# Altium schematic symbol library SignalCommunications.SCHLIB: 804 symbols (part 5 of 9)
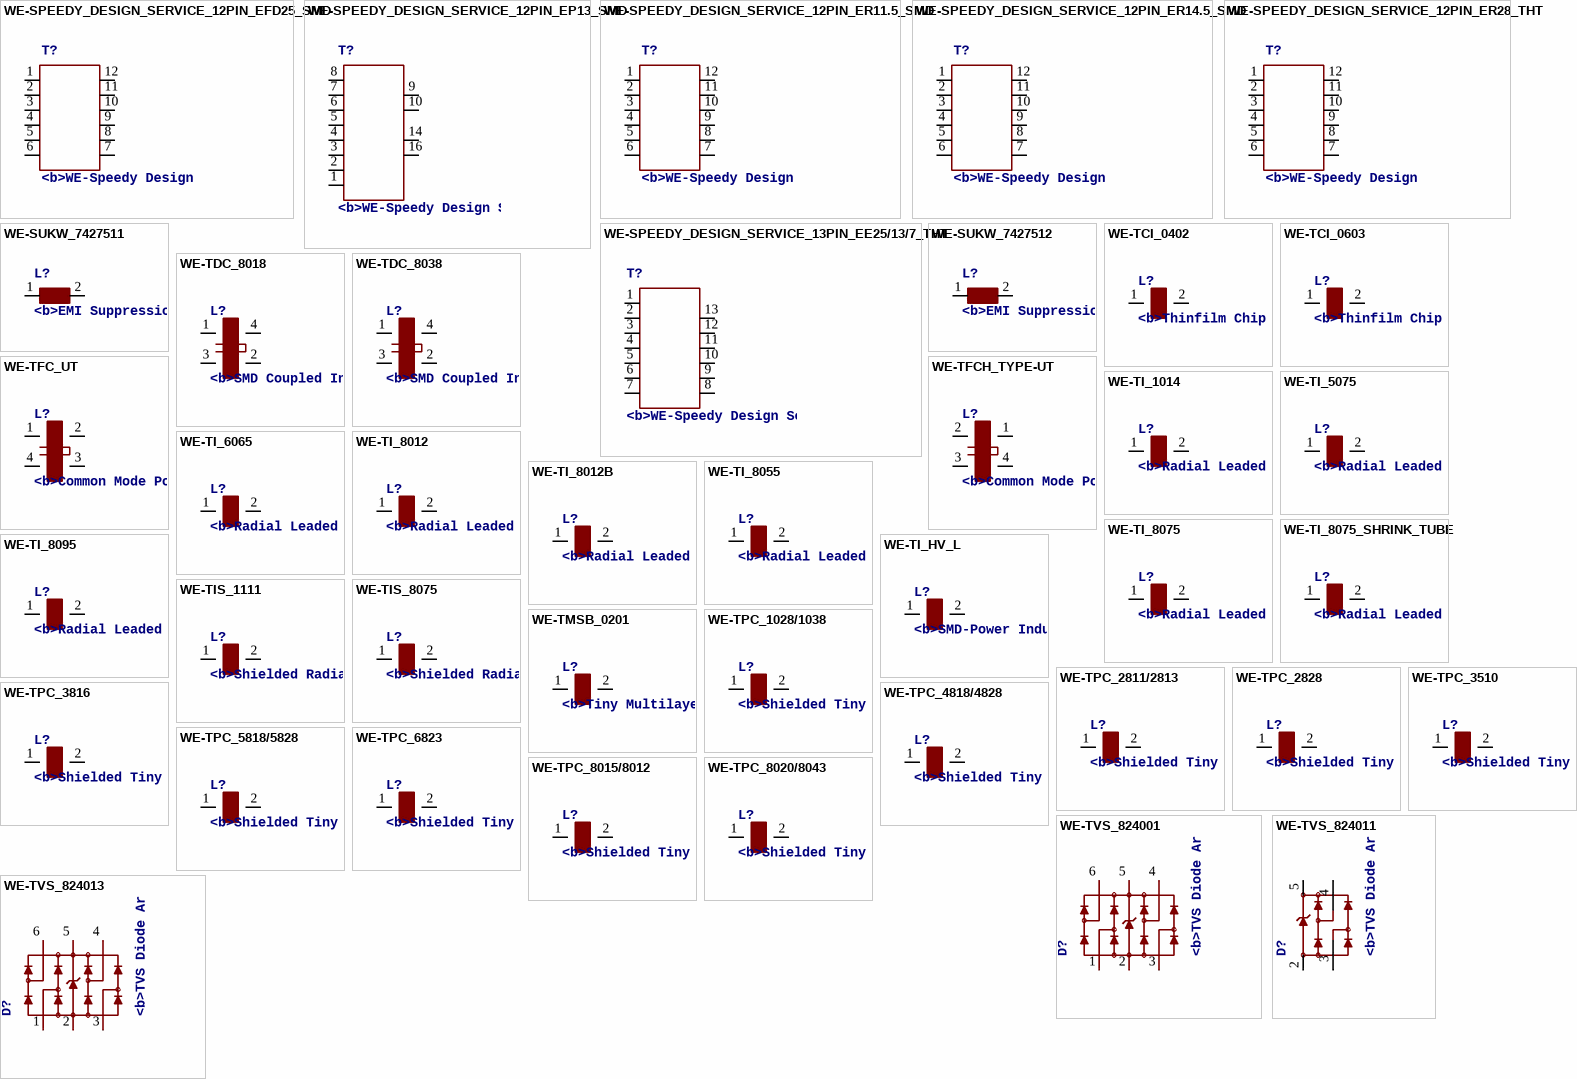
[diagram p46: symbols WE-SPEEDY_DESIGN_SERVICE_12PIN_EFD25_SMD to WE-TVS_824013]

## WE-SPEEDY_DESIGN_SERVICE_12PIN_EP13_SMD
designator T?, comment <b>WE-Speedy Design Service, 12 Pin</b><br><br> / - Any application that fits package style <br> / - Switch Mode Power: Flyback, Forward, Push-Pull, Coupled Inductor<br><br> / -- Telecom Applications: xDSL, POTS Splitter Inductors
footprint WE_EP13_SMD_12PIN
pins: 1, 2, 3, 4, 5, 6, 7, 8, 9, 10, 14 11, 16 12

## WE-SPEEDY_DESIGN_SERVICE_12PIN_ER11.5_SMD
designator T?, comment <b>WE-Speedy Design Service, 12 Pin</b><br><br> / - Any application that fits package style <br> / - Switch Mode Power: Flyback, Forward, Push-Pull, Coupled Inductor<br><br> / -- Telecom Applications: xDSL, POTS Splitter Inductors
footprint WE_ER11.5_SMD_12PIN
pins: 1, 2, 3, 4, 5, 6, 7, 8, 9, 10, 11, 12

## WE-SPEEDY_DESIGN_SERVICE_12PIN_ER14.5_SMD
designator T?, comment <b>WE-Speedy Design Service, 12 Pin</b><br><br> / - Any application that fits package style <br> / - Switch Mode Power: Flyback, Forward, Push-Pull, Coupled Inductor<br><br> / -- Telecom Applications: xDSL, POTS Splitter Inductors
footprint WE_ER14.5_SMD_12PIN
pins: 1, 2, 3, 4, 5, 6, 7, 8, 9, 10, 11, 12

## WE-SPEEDY_DESIGN_SERVICE_12PIN_ER28_THT
designator T?, comment <b>WE-Speedy Design Service, 12 Pin</b><br><br> / - Any application that fits package style <br> / - Switch Mode Power: Flyback, Forward, Push-Pull, Coupled Inductor<br><br> / -- Telecom Applications: xDSL, POTS Splitter Inductors
footprint WE_ER28_THT_HORIZONTAL_12PIN
pins: 1, 2, 3, 4, 5, 6, 7, 8, 9, 10, 11, 12

## WE-SPEEDY_DESIGN_SERVICE_13PIN_EE25/13/7_THT
designator T?, comment <b>WE-Speedy Design Service, 13 Pin</b><br><br> / - Any application that fits package style <br> / - Switch Mode Power: Flyback, Forward, Push-Pull, Coupled Inductor<br><br> / -- Telecom Applications: xDSL, POTS Splitter Inductors
footprint WE_EE25/13/7_THT_HORIZONTAL_13PIN
pins: 1, 2, 3, 4, 5, 6, 7, 8, 9, 10, 11, 12, 13

## WE-SUKW_7427511
designator L?, comment <b>EMI Suppression 5-Hole Ferrite Bead WE-SUKW</b><p> / - Rated current up to 5 A<br> / - Impedances up to 580 ohms<br> / - Low DC resistance with 3 mohms<p> / -- Protection against radio frequency interferences of components on PCB´s of PC´s, text processing and other digital devices<br> / -- Typical in power supply<br> / -- Power electronics
footprint WE-SUKW_7427511
pins: 1, 2

## WE-SUKW_7427512
designator L?, comment <b>EMI Suppression 5-Hole Ferrite Bead WE-SUKW</b><p> / - Rated current up to 5 A<br> / - Impedances up to 580 ohms<br> / - Low DC resistance with 3 mohms<p> / -- Protection against radio frequency interferences of components on PCB´s of PC´s, text processing and other digital devices<br> / -- Typical in power supply<br> / -- Power electronics
footprint WE-SUKW_7427512
pins: 1, 2

## WE-TCI_0402
designator L?, comment <b>Thinfilm Chip Inductor WE-TCI</b><br><br> / - High self resonant frequency<br> / - excellent Q<br> / - tight inductance tolerance of 2% or 0,1 nH and small inductance values<br> / - In high frequency circuit the inductance is very stable<br> / - Small inductance values<br><br> / -- Cellular Telephone<br> / -- Pagers<br> / -- GPS products<br> / -- Wireless LAN<br> / -- Communication appliances<br> / -- RF Transceiver Module
footprint WE-TCI_0402
pins: 1, 2

## WE-TCI_0603
designator L?, comment <b>Thinfilm Chip Inductor WE-TCI</b><br><br> / - High self resonant frequency<br> / - excellent Q<br> / - tight inductance tolerance of 2% or 0,1 nH and small inductance values<br> / - In high frequency circuit the inductance is very stable<br> / - Small inductance values<br><br> / -- Cellular Telephone<br> / -- Pagers<br> / -- GPS products<br> / -- Wireless LAN<br> / -- Communication appliances<br> / -- RF Transceiver Module
footprint WE-TCI_0603
pins: 1, 2

## WE-TDC_8018
designator L?, comment <b>SMD Coupled Inductor WE-TDC</b><br><br> / - 1:1 transformer <br> / - Double inductor with two identical windings<br><br> / -- for SEPIC and CUK topologies<br> / -- Flyback applications<br> / -- Switching regulators with second, unregulated output voltag
footprint WE-TDC_80XX
pins: 1 3, 2, 3 1, 4

## WE-TDC_8038
designator L?, comment <b>SMD Coupled Inductor WE-TDC</b><br><br> / - 1:1 transformer <br> / - Double inductor with two identical windings<br><br> / -- for SEPIC and CUK topologies<br> / -- Flyback applications<br> / -- Switching regulators with second, unregulated output voltag
footprint WE-TDC_80XX
pins: 1 3, 2, 3 1, 4

## WE-TFC_UT
designator L?, comment <b>Common Mode Power Line Choke WE-TFC</b><br><br> / - approximinate 1% stray inductance for symmetrical interference suppression<br><br> / -- main filter<br> / .. suppression of common mode noise<br> / -- compact switch mode power supplier<br> / -- lighting<br> / -- white goods
footprint WE-TFC
pins: 1 3, 2 4, 3 2, 4 1

## WE-TFCH_TYPE-UT
designator L?, comment <b>Common Mode Power Line Choke (Horizontal) WE-TFCH</b><p> / - Approximate 1% stray inductance for symmetrical interference suppression<br> / <br> / -- Mains filter <br> / -- Suppression of common mode noise <br> / -- Compact switch mode power supplies <br> / -- Electronic ballast applications (LED bulb)<br> / --Lighting
MANUFACTURER: Würth Elektronik eiSos GmbH; CREATED-BY: Christin Otto; COMPANY-URL: http://www.we-online.de; CREATED-DATE: MAR 2013; DATASHEET-URL: http://katalog.we-online.de/en/pbs/WE-TFCH?m=t&sq=tfch&sp=&sp=http%3A%2F%2Fwww.we-online.de%2Fweb%2Fen%2Felectronic_components%2Fsearchpage_PBS.php%3Fsearch%3DTFCH
footprint WE-TFCH
pins: 1 4, 2 3, 3 1, 4 2

## WE-TI_1014
designator L?, comment <b>Radial Leaded Wire Wound Inductor WE-TI</b><p> / - Radial through-hole inductor<br> / - High saturation core material<br> / - Small size<br> / - maximum current up to 7,5 A<p> / -- Signal filtering<br> / -- NF-switches, switching power supply for small and medium voltage<br> / -- Power supply filter
footprint WE-TI_1014
pins: 1, 2

## WE-TI_5075
designator L?, comment <b>Radial Leaded Wire Wound Inductor WE-TI</b><p> / - Radial through-hole inductor<br> / - High saturation core material<br> / - Small size<br> / - maximum current up to 7,5 A<p> / -- Signal filtering<br> / -- NF-switches, switching power supply for small and medium voltage<br> / -- Power supply filter
footprint WE-TI_5075
pins: 1, 2

## WE-TI_6065
designator L?, comment <b>Radial Leaded Wire Wound Inductor WE-TI</b><p> / - Radial through-hole inductor<br> / - High saturation core material<br> / - Small size<br> / - maximum current up to 7,5 A<p> / -- Signal filtering<br> / -- NF-switches, switching power supply for small and medium voltage<br> / -- Power supply filter
footprint WE-TI_6065
pins: 1, 2

## WE-TI_8012
designator L?, comment <b>Radial Leaded Wire Wound Inductor WE-TI</b><p> / - Radial through-hole inductor<br> / - High saturation core material<br> / - Small size<br> / - maximum current up to 7,5 A<p> / -- Signal filtering<br> / -- NF-switches, switching power supply for small and medium voltage<br> / -- Power supply filter
footprint WE-TI_8012
pins: 1, 2

## WE-TI_8012B
designator L?, comment <b>Radial Leaded Wire Wound Inductor WE-TI</b><p> / - Radial through-hole inductor<br> / - High saturation core material<br> / - Small size<br> / - maximum current up to 7,5 A<p> / -- Signal filtering<br> / -- NF-switches, switching power supply for small and medium voltage<br> / -- Power supply filter
footprint WE-TI_8012B
pins: 1, 2

## WE-TI_8055
designator L?, comment <b>Radial Leaded Wire Wound Inductor WE-TI</b><p> / - Radial through-hole inductor<br> / - High saturation core material<br> / - Small size<br> / - maximum current up to 7,5 A<p> / -- Signal filtering<br> / -- NF-switches, switching power supply for small and medium voltage<br> / -- Power supply filter
footprint WE-TI_8055
pins: 1, 2

## WE-TI_8075
designator L?, comment <b>Radial Leaded Wire Wound Inductor WE-TI</b><p> / - Radial through-hole inductor<br> / - High saturation core material<br> / - Small size<br> / - maximum current up to 7,5 A<p> / -- Signal filtering<br> / -- NF-switches, switching power supply for small and medium voltage<br> / -- Power supply filter
footprint WE-TI_8075
pins: 1, 2

## WE-TI_8075_SHRINK_TUBE
designator L?, comment <b>Radial Leaded Wire Wound Inductor WE-TI</b><p> / - Radial through-hole inductor<br> / - High saturation core material<br> / - Small size<br> / - maximum current up to 7,5 A<p> / -- Signal filtering<br> / -- NF-switches, switching power supply for small and medium voltage<br> / -- Power supply filter
footprint WE-TI_8075_SHRINKTUBE
pins: 1, 2

## WE-TI_8095
designator L?, comment <b>Radial Leaded Wire Wound Inductor WE-TI</b><p> / - Radial through-hole inductor<br> / - High saturation core material<br> / - Small size<br> / - maximum current up to 7,5 A<p> / -- Signal filtering<br> / -- NF-switches, switching power supply for small and medium voltage<br> / -- Power supply filter
footprint WE-TI_8095
pins: 1, 2

## WE-TI_HV_L
designator L?, comment <b>SMD-Power Inductors WE-TI HV</b><p> / - Unshielde construction<br> / - Designed for 400VDC<br> / - Radial through-hole inductor<br> / - High saturation core material<p> / -- Non-isolated buck or buck-boost converter like Power Integrations LinkSwitch-TN<br> / -- Constant current LED driver<br> / -- Utility metering<br> / -- Filter for power supply
footprint WE-TI_8095
pins: 1, 2

## WE-TIS_1111
designator L?, comment <b>Shielded Radial Leaded Inductor</b><p> / - Shielded radial through-hole inductor<br> / - High rated and saturation current<br> / - High inductance values<br> / - Low stray field<br><br> / -- Filter choke<br> / -- Storage choke<br> / -- Class D amplifiers
footprint WE-TIS_1111
pins: 1, 2

## WE-TIS_8075
designator L?, comment <b>Shielded Radial Leaded Inductor</b><p> / - Shielded radial through-hole inductor<br> / - High rated and saturation current<br> / - High inductance values<br> / - Low stray field<br><br> / -- Filter choke<br> / -- Storage choke<br> / -- Class D amplifiers
footprint WE-TIS_8075
pins: 1, 2

## WE-TMSB_0201
designator L?, comment <b>Tiny Multilayer Suppression Bead WE-TMSB</b><p> / - Perfect for Miniaturization of EMI solutions<br> / - Wide Impedance range from 10 up to 300 Ω<br> / - Operating Temperature: –55 °C  to +125 °C<p> / -- General signal and low power lines<br> / -- Audio-, video-, clocklines<br> / -- Small handheld<br>
MANUFACTURER: Würth Elektronik eiSos GmbH; CREATED-BY: Christin Otto; COMPANY-URL: http://www.we-online.de; CREATED-DATE: August 2013; DATASHEET-URL: http://katalog.we-online.de/de/pbs/WE-TMSB?sid=4c5a5b26c6
footprint WE-TMSB_0201
pins: 1, 2

## WE-TPC_1028/1038
designator L?, comment <b>Shielded Tiny Power Inductor WE-TPC</b><p> / - Extremely flat power inductor<br> / - High current capability<br> / - High reliability and perfect soldering characteristics<br> / because of integrated soldering pad<br> / - magnetically shielded<br><br> / -- Portable power like PDA, digital camera, / PCMICA-cards and displays<br> / -- DC/DC-converter<br> / -- Recommended for switching regulator IC's from / Linear Technology, National Semiconductor, / Texas Instruments and Fairchild Semiconductor
footprint WE-TPC_1028/1038
pins: 1, 2

## WE-TPC_2811/2813
designator L?, comment <b>Shielded Tiny Power Inductor WE-TPC</b><p> / - Extremely flat power inductor<br> / - High current capability<br> / - High reliability and perfect soldering characteristics<br> / because of integrated soldering pad<br> / - magnetically shielded<br><br> / -- Portable power like PDA, digital camera, / PCMICA-cards and displays<br> / -- DC/DC-converter<br> / -- Recommended for switching regulator IC's from / Linear Technology, National Semiconductor, / Texas Instruments and Fairchild Semiconductor
footprint WE-TPC_2811/2813
pins: 1, 2

## WE-TPC_2828
designator L?, comment <b>Shielded Tiny Power Inductor WE-TPC</b><p> / - Extremely flat power inductor<br> / - High current capability<br> / - High reliability and perfect soldering characteristics<br> / because of integrated soldering pad<br> / - magnetically shielded<br><br> / -- Portable power like PDA, digital camera, / PCMICA-cards and displays<br> / -- DC/DC-converter<br> / -- Recommended for switching regulator IC's from / Linear Technology, National Semiconductor, / Texas Instruments and Fairchild Semiconductor
footprint WE-TPC_2828
pins: 1, 2

## WE-TPC_3510
designator L?, comment <b>Shielded Tiny Power Inductor WE-TPC</b><p> / - Extremely flat power inductor<br> / - High current capability<br> / - High reliability and perfect soldering characteristics<br> / because of integrated soldering pad<br> / - magnetically shielded<br><br> / -- Portable power like PDA, digital camera, / PCMICA-cards and displays<br> / -- DC/DC-converter<br> / -- Recommended for switching regulator IC's from / Linear Technology, National Semiconductor, / Texas Instruments and Fairchild Semiconductor
footprint WE-TPC_3510
pins: 1, 2

## WE-TPC_3816
designator L?, comment <b>Shielded Tiny Power Inductor WE-TPC</b><p> / - Extremely flat power inductor<br> / - High current capability<br> / - High reliability and perfect soldering characteristics<br> / because of integrated soldering pad<br> / - magnetically shielded<br><br> / -- Portable power like PDA, digital camera, / PCMICA-cards and displays<br> / -- DC/DC-converter<br> / -- Recommended for switching regulator IC's from / Linear Technology, National Semiconductor, / Texas Instruments and Fairchild Semiconductor
footprint WE-TPC_3816
pins: 1, 2

## WE-TPC_4818/4828
designator L?, comment <b>Shielded Tiny Power Inductor WE-TPC</b><p> / - Extremely flat power inductor<br> / - High current capability<br> / - High reliability and perfect soldering characteristics<br> / because of integrated soldering pad<br> / - magnetically shielded<br><br> / -- Portable power like PDA, digital camera, / PCMICA-cards and displays<br> / -- DC/DC-converter<br> / -- Recommended for switching regulator IC's from / Linear Technology, National Semiconductor, / Texas Instruments and Fairchild Semiconductor
footprint WE-TPC_4818/4828
pins: 1, 2

## WE-TPC_5818/5828
designator L?, comment <b>Shielded Tiny Power Inductor WE-TPC</b><p> / - Extremely flat power inductor<br> / - High current capability<br> / - High reliability and perfect soldering characteristics<br> / because of integrated soldering pad<br> / - magnetically shielded<br><br> / -- Portable power like PDA, digital camera, / PCMICA-cards and displays<br> / -- DC/DC-converter<br> / -- Recommended for switching regulator IC's from / Linear Technology, National Semiconductor, / Texas Instruments and Fairchild Semiconductor
footprint WE-TPC_5818/5828
pins: 1, 2

## WE-TPC_6823
designator L?, comment <b>Shielded Tiny Power Inductor WE-TPC</b><p> / - Extremely flat power inductor<br> / - High current capability<br> / - High reliability and perfect soldering characteristics<br> / because of integrated soldering pad<br> / - magnetically shielded<br><br> / -- Portable power like PDA, digital camera, / PCMICA-cards and displays<br> / -- DC/DC-converter<br> / -- Recommended for switching regulator IC's from / Linear Technology, National Semiconductor, / Texas Instruments and Fairchild Semiconductor
footprint WE-TPC_6823
pins: 1, 2

## WE-TPC_8015/8012
designator L?, comment <b>Shielded Tiny Power Inductor WE-TPC</b><p> / - Extremely flat power inductor<br> / - High current capability<br> / - High reliability and perfect soldering characteristics<br> / because of integrated soldering pad<br> / - magnetically shielded<br><br> / -- Portable power like PDA, digital camera, / PCMICA-cards and displays<br> / -- DC/DC-converter<br> / -- Recommended for switching regulator IC's from / Linear Technology, National Semiconductor, / Texas Instruments and Fairchild Semiconductor
footprint WE-TPC_8015/8012
pins: 1, 2

## WE-TPC_8020/8043
designator L?, comment <b>Shielded Tiny Power Inductor WE-TPC</b><p> / - Extremely flat power inductor<br> / - High current capability<br> / - High reliability and perfect soldering characteristics<br> / because of integrated soldering pad<br> / - magnetically shielded<br><br> / -- Portable power like PDA, digital camera, / PCMICA-cards and displays<br> / -- DC/DC-converter<br> / -- Recommended for switching regulator IC's from / Linear Technology, National Semiconductor, / Texas Instruments and Fairchild Semiconductor
footprint WE-TPC_8020/8043
pins: 1, 2

## WE-TVS_824001
designator D?, comment <b>TVS Diode Array WE-TVS, High Speed Series</b><br><br> / - Low capazity<br> / - No leakage current<br> / - Low clamping voltage<br> / - high ESD voltage protection<br><br> / -- USB 1.0 - 2.0 Double Port<br> / -- Ethernet<br>
footprint WE-TVS_SOT23-6L
pins: 1, 2 GND (power), 3 2, 4 3, 5 VDD (power), 6 4

## WE-TVS_824011
designator D?, comment <b>TVS Diode Array WE-TVS, High Speed Series</b><br><br> / - Low capazity<br> / - No leakage current<br> / - Low clamping voltage<br> / - high ESD voltage protection<br><br> / -- USB 1.0 - 2.0 <br>
footprint WE-TVS_SOT23-5L
pins: 2 GND (power), 3 1, 4 2, 5 VDD (power)

## WE-TVS_824013
designator D?, comment <b>TVS Diode Array WE-TVS, High Speed Series</b><br><br> / - Low capazity<br> / - No leakage current<br> / - Low clamping voltage<br> / - high ESD voltage protection<br><br> / -- 3.3 VDC Application<br>
footprint WE-TVS_SOT23-6L
pins: 1, 2 GND (power), 3 2, 4 3, 5 VDD (power), 6 4

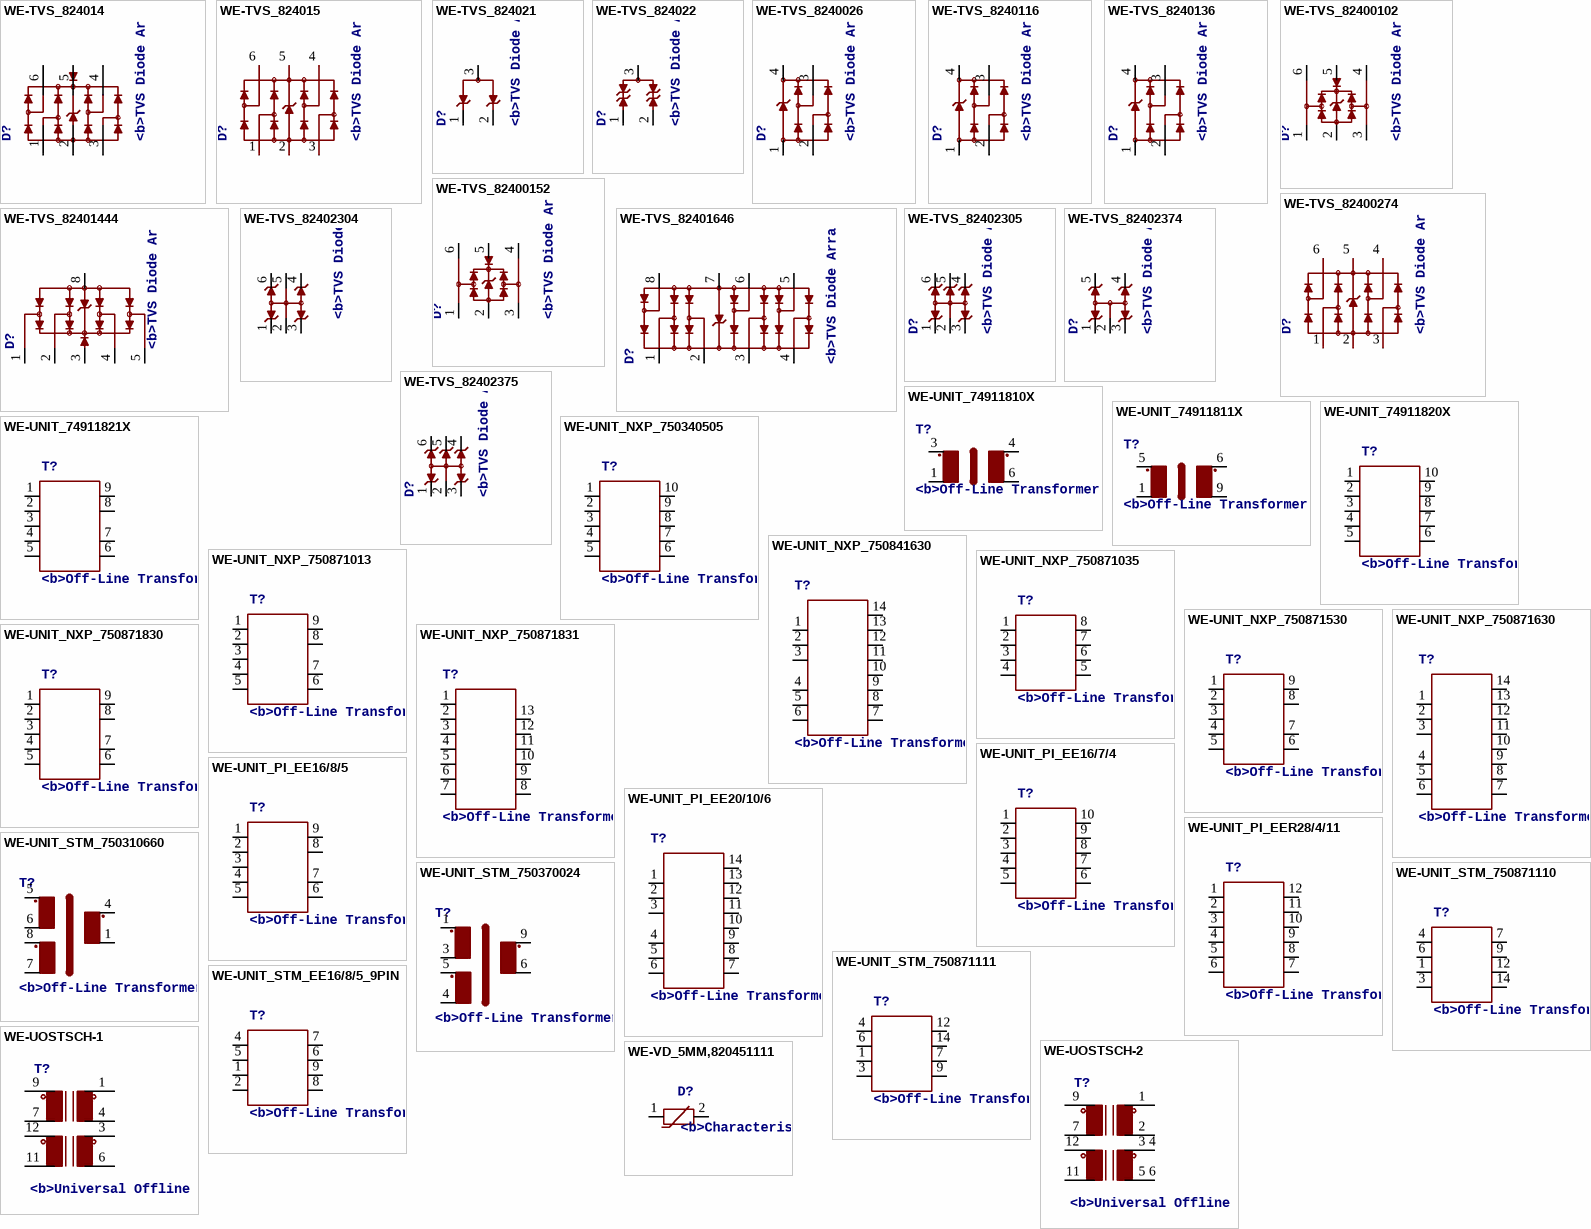
[diagram p33: symbols WE-TVS_824014 to WE-VD_5MM,820451111]

## WE-TVS_824014
designator D?, comment <b>TVS Diode Array WE-TVS, Super Speed Serie</b><br><br> / - Low capazity<br> / - No leakage current<br> / - Low clamping voltage<br> / - high ESD voltage protection<br><br> / -- SATA<br> / -- DisplayPort<br> / -- DVI<br> / -- HDMI
footprint WE-TVS_SOT23-6L
pins: 1, 2 GND (power), 3 2, 4 3, 5 VDD (power), 6 4

## WE-TVS_824015
designator D?, comment <b>TVS Diode Array WE-TVS, High Speed Series</b><br><br> / - Low capazity<br> / - No leakage current<br> / - Low clamping voltage<br> / - high ESD voltage protection<br><br> / -- USB 1.0 - 2.0 Double Port<br> / -- Ethernet<br>
footprint WE-TVS_SOT23-6L
pins: 1, 2 GND (power), 3 2, 4 3, 5 VDD (power), 6 4

## WE-TVS_824021
designator D?, comment <b>TVS Diode Array WE-TVS, Standard Series</b><br><br> / - Low capazity<br> / - No leakage current<br> / - Low clamping voltage<br> / - high ESD voltage protection<br> / - Uni- and bidirectional protection<br><br> / -- DC Distribution<br> / -- Headsets and Accessoires<br> / -- PDAs<br> / -- Digital Cameras<br> / -- MP3-Players<br> / -- Touch Panels
footprint WE-TVS_SOT23-3L
pins: 1, 2, 3 GND (power)

## WE-TVS_824022
designator D?, comment <b>TVS Diode Array WE-TVS, Standard Series</b><br><br> / - Low capazity<br> / - No leakage current<br> / - Low clamping voltage<br> / - high ESD voltage protection<br> / - Uni- and bidirectional protection<br><br> / -- DC Distribution<br> / -- Headsets and Accessoires<br> / -- PDAs<br> / -- Digital Cameras<br> / -- MP3-Players<br> / -- Touch Panels
footprint WE-TVS_SOT23-3L
pins: 1, 2, 3 GND (power)

## WE-TVS_8240026
designator D?, comment <b>TVS Diode Array WE-TVS, High Speed Series</b><br><br> / - Low capazity<br> / - No leakage current<br> / - Low clamping voltage<br> / - high ESD voltage protection<br><br> / -- USB 1.0 - 2.0 <br>
footprint WE-TVS_SOT143-4L
pins: 1 GND (power), 2 1, 3 2, 4 VDD (power)

## WE-TVS_8240116
designator D?, comment <b>TVS Diode Array WE-TVS, High Speed Series</b><br><br> / - Low capazity<br> / - No leakage current<br> / - Low clamping voltage<br> / - high ESD voltage protection<br><br> / -- USB 1.0 - 2.0 <br>
footprint WE-TVS_SOT143-4L
pins: 1 GND (power), 2 1, 3 2, 4 VDD (power)

## WE-TVS_8240136
designator D?, comment <b>TVS Diode Array WE-TVS, High Speed Series</b><br><br> / - Low capazity<br> / - No leakage current<br> / - Low clamping voltage<br> / - high ESD voltage protection<br><br> / -- 3.3 VDC Application<br>
footprint WE-TVS_SOT143-4L
pins: 1 GND (power), 2 1, 3 2, 4 VDD (power)

## WE-TVS_82400102
designator D?, comment <b>TVS Diode Array WE-TVS, High Speed Series</b><br><br> / - Low capazity<br> / - No leakage current<br> / - Low clamping voltage<br> / - high ESD voltage protection<br><br> / -- USB 1.0 - 2.0 Flow Thru Design<br>
footprint WE-TVS_SOT23-6L
pins: 1, 2 GND (power), 3 2, 4 3, 5 VDD (power), 6 4

## WE-TVS_82400152
designator D?, comment <b>TVS Diode Array WE-TVS, High Speed Series</b><br><br> / - Low capazity<br> / - No leakage current<br> / - Low clamping voltage<br> / - high ESD voltage protection<br><br> / -- USB 1.0 - 2.0 Flow Thru Design<br>
footprint WE-TVS_SOT563
pins: 1, 2 GND (power), 3 2, 4 3, 5 VDD (power), 6 4

## WE-TVS_82400274
designator D?, comment <b>TVS Diode Array WE-TVS, High Speed Series</b><br><br> / - Low capazity<br> / - No leakage current<br> / - Low clamping voltage<br> / - high ESD voltage protection<br><br> / -- USB 1.0 - 2.0 Double Port<br> / -- Ethernet<br>
footprint WE-TVS_SC70-6L
pins: 1, 2 GND (power), 3 2, 4 3, 5 VDD (power), 6 4

## WE-TVS_82401444
designator D?, comment <b>TVS Diode Array WE-TVS, Super Speed Serie</b><br><br> / - Low capazity<br> / - No leakage current<br> / - Low clamping voltage<br> / - high ESD voltage protection<br><br> / -- SATA<br> / -- DisplayPort<br> / -- DVI<br> / -- HDMI
footprint WE-TVS_MSOP-10L
pins: 1, 2, 3 VDD (power), 4 3, 5 4, 8 GND (power)

## WE-TVS_82401646
designator D?, comment <b>TVS Diode Array WE-TVS, Super Speed Serie</b><br><br> / - Low capazity<br> / - No leakage current<br> / - Low clamping voltage<br> / - high ESD voltage protection<br><br> / -- USB 3.0<br>
footprint WE-TVS_MSOP-8L
pins: 1, 2, 3, 4, 5, 6, 7 GND (power), 8 VDD (power)

## WE-TVS_82402304
designator D?, comment <b>TVS Diode Array WE-TVS, Standard Series</b><br><br> / - Low capazity<br> / - No leakage current<br> / - Low clamping voltage<br> / - high ESD voltage protection<br> / - Uni- and bidirectional protection<br><br> / -- DC Distribution<br> / -- Headsets and Accessoires<br> / -- PDAs<br> / -- Digital Cameras<br> / -- MP3-Players<br> / -- Touch Panels
footprint WE-TVS_SOT23-6L
pins: 1, 2 GND (power), 3 2, 4 3, 5 GND (power), 6 4

## WE-TVS_82402305
designator D?, comment <b>TVS Diode Array WE-TVS, Standard Series</b><br><br> / - Low capazity<br> / - No leakage current<br> / - Low clamping voltage<br> / - high ESD voltage protection<br> / - Uni- and bidirectional protection<br><br> / -- DC Distribution<br> / -- Headsets and Accessoires<br> / -- PDAs<br> / -- Digital Cameras<br> / -- MP3-Players<br> / -- Touch Panels
footprint WE-TVS_SOT23-6L
pins: 1, 2 GND (power), 3 2, 4 3, 5 4, 6 5

## WE-TVS_82402374
designator D?, comment <b>TVS Diode Array WE-TVS, Standard Series</b><br><br> / - Low capazity<br> / - No leakage current<br> / - Low clamping voltage<br> / - high ESD voltage protection<br> / - Uni- and bidirectional protection<br><br> / -- DC Distribution<br> / -- Headsets and Accessoires<br> / -- PDAs<br> / -- Digital Cameras<br> / -- MP3-Players<br> / -- Touch Panels
footprint WE-TVS_SC70-5L
pins: 1, 2 GND (power), 3 2, 4 3, 5 4

## WE-TVS_82402375
designator D?, comment <b>TVS Diode Array WE-TVS, Standard Series</b><br><br> / - Low capazity<br> / - No leakage current<br> / - Low clamping voltage<br> / - high ESD voltage protection<br> / - Uni- and bidirectional protection<br><br> / -- DC Distribution<br> / -- Headsets and Accessoires<br> / -- PDAs<br> / -- Digital Cameras<br> / -- MP3-Players<br> / -- Touch Panels
footprint WE-TVS_SC70-6L
pins: 1, 2 GND (power), 3 2, 4 3, 5 4, 6 5

## WE-UNIT_74911810X
designator T?, comment <b>Off-Line Transformer WE-Unit</b><br><br> / - Nominal input voltage: 85-265 VAC<br> / - Output power 3 W <br> / - Operating temperature: -40°C to +125 °C<br> / - Clearance and creepage distance 6 mm min.<br> / - Isolation voltage 4 kVAC<br><br> / -- Designed for Tiny switch ICs from power integration and NCP101x or 105x of Semiconductor<br> / -- Universal input<br> / -- Offline-switch mode power supplies
footprint WE_E13/7/4_THT_VERTIKAL_6PIN
pins: 1 3, 3 1, 4 6, 6 4